# Altium footprint library LOCALLIBPCB1.PcbLib: 7 footprints
Each footprint in its own frame and in the unit in brackets; x right, y up, seen from the top. Pads: shape width x height; smd on the part's side, far side on the other; paste and mask are expansions set on the pad; w line width, h text height; cw(c..) or ccw(c..) is an arc to the next point about the centre after c.
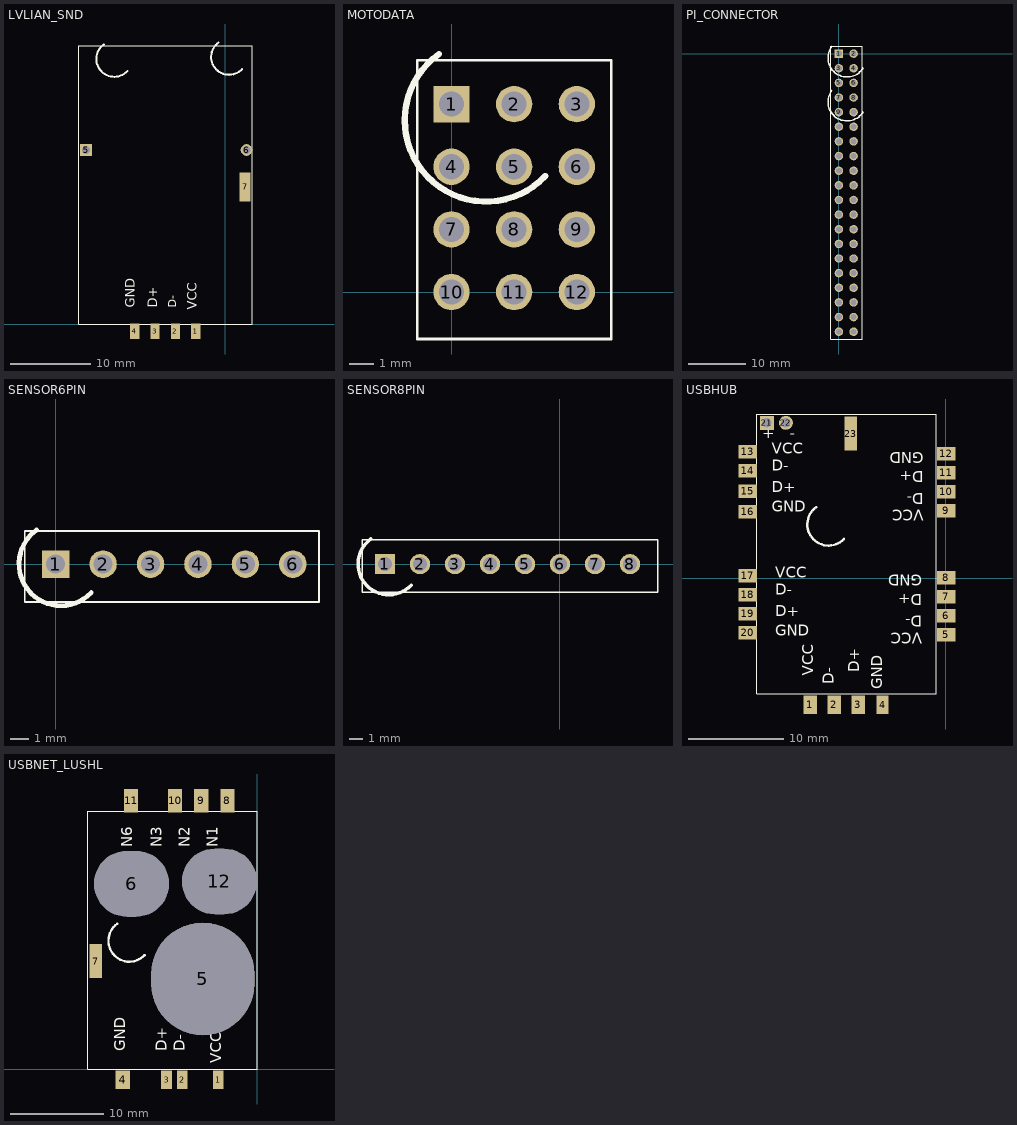
[diagram p0: the footprints below, top view; thin cyan lines are the x and y axes]

## LVLIAN_SND [mil] "绿联声卡"
pads (7):
  rect 45x77 smd: 1(-145,-35) 2(-245,-35) 3(-345,-35) 4(-445,-35)
  rect 58x58 hole 40: 5(-685,856.81)
  round 58 hole 40: 6(105,856.81)
  rect 53.15x141.73 smd: 7(97.83,675)
Top Overlay:
  lines w4: -722.17,0 -722.17,1370.08 132.17,1370.08 132.17,0 -722.17,0
  lines w10: -597.23,1377.02 ccw(c-546.29,1305.27) -482.17,1245 ; -32.23,1387.02 ccw(c18.71,1315.27) 82.83,1255
  text "GND" at -427.17,80 h78.74
  text "D+" at -317.17,80 h78.74
  text "D-" at -227.17,80 h67.32
  text "VCC" at -122.17,70 h78.74

## MOTODATA [mil] "4路舵机信号插件"
pads (12):
  rect 58x58 hole 40: 1(0,300)
  round 58 hole 40: 2(100,300) 3(200,300) 4(0,200) 5(100,200) 6(200,200) 7(0,100) 8(100,100) 9(200,100) 10(0,0) 11(100,0) 12(200,0)
Top Overlay:
  lines w4: -55,-75 -55,370 255,370 255,-75 -55,-75
  lines w10: -20,380 ccw(c55.14,274.15) 149.73,185.25

## PI_CONNECTOR [mil] "pi3上的40针插件"
pads (40):
  rect 58x58 hole 40: 1(0,0)
  round 58 hole 40: 2(100,0) 3(0,-100) 4(100,-100) 5(0,-200) 6(100,-200) 7(0,-300) 8(100,-300) 9(0,-400) 10(100,-400) 11(0,-500) 12(100,-500) 13(0,-600) 14(100,-600) 15(0,-700) 16(100,-700) 17(0,-800) 18(100,-800) 19(0,-900) 20(100,-900) 21(0,-1000) 22(100,-1000) 23(0,-1100) 24(100,-1100) 25(0,-1200) 26(100,-1200) 27(0,-1300) 28(100,-1300) 29(0,-1400) 30(100,-1400) 31(0,-1500) 32(100,-1500) 33(0,-1600) 34(100,-1600) 35(0,-1700) 36(100,-1700) 37(0,-1800) 38(100,-1800) 39(0,-1900) 40(100,-1900)
Top Overlay:
  lines w4: -55,-1950 -55,50 160,50 160,-1950 -55,-1950
  lines w10: -48.13,48.58 ccw(c55.19,-30) 166.9,-96.12 ; -47.59,-250.72 ccw(c55.19,-330) 166.9,-396.12

## SENSOR6PIN [mil] "6针传感器"
pads (6):
  rect 58x58 hole 40: 1(0,0)
  round 58 hole 40: 2(100,0) 3(200,0) 4(300,0) 5(400,0) 6(500,0)
Top Overlay:
  lines w4: -65,-80 -65,70 555,70 555,-80 -65,-80
  lines w10: -40.06,72.02 ccw(c10.88,0.27) 75,-60

## SENSOR8PIN [mil] "8针传感器"
pads (8):
  rect 58x58 hole 40: 1(-500,0)
  round 58 hole 40: 2(-400,0) 3(-300,0) 4(-200,0) 5(-100,0) 6(0,0) 7(100,0) 8(200,0)
Top Overlay:
  lines w4: -565,-80 -565,70 280,70 280,-80 -565,-80
  lines w10: -540.06,72.02 ccw(c-489.12,0.27) -425,-60

## USBHUB [mil] "USB一转四"
pads (23):
  rect 56.3x77 smd: 1(-562.95,-525) 2(-462.95,-525) 3(-362.95,-525)
  rect 51.18x77 smd: 4(-262.95,-525)
  rect 77x56.3 smd: 5(2.05,-235) 6(2.05,-156.26) 7(2.05,-77.52) 8(2.05,1.22) 9(2.05,280) 10(2.05,358.74) 11(2.05,437.48) 12(2.05,516.22) 13(-822.95,525) 14(-822.95,446.26) 15(-822.95,360) 16(-822.95,275) 17(-822.95,10) 18(-822.95,-68.74) 19(-822.95,-147.48) 20(-822.95,-226.22)
  rect 58x58 hole 40: 21(-742.95,645)
  round 58 hole 40: 22(-664.21,645)
  rect 53.15x141.73 smd: 23(-395,600)
Top Overlay:
  lines w4: -785,-480 -40.91,-480 -40.91,681.42 -785,681.42 -785,-480
  lines w10: -537.95,295 ccw(c-487.01,223.24) -422.89,162.98
  text "+   -" at -762.95,565 h78.74
  text "GND" at -707.95,-255 h78.74
  text "D+" at -707.95,-175 h78.74
  text "D-" at -707.95,-85 h78.74
  text "VCC" at -707.95,-15 h78.74
  text "GND" at -722.95,260 h78.74
  text "D+" at -722.95,340 h78.74
  text "D-" at -722.95,430 h78.74
  text "VCC" at -722.95,500 h78.74
  text "GND" at -92.95,540 h78.74
  text "D+" at -92.95,460 h78.74
  text "D-" at -92.95,370 h78.74
  text "VCC" at -92.95,300 h78.74
  text "VCC" at -97.95,-210 h78.74
  text "D-" at -97.95,-140 h78.74
  text "D+" at -97.95,-50 h78.74
  text "GND" at -97.95,30 h78.74
  text "GND" at -247.95,-460 h78.74
  text "D+" at -342.95,-390 h78.74
  text "D-" at -447.95,-440 h78.74
  text "VCC" at -532.95,-405 h78.74

## USBNET_LUSHL [mm] "铝壳USB转NET"
pads (12):
  rect 1.143x1.956 smd: 1(-4.18,-1.143) 2(-8.05,-1.143) 3(-9.72,-1.143)
  rect 1.53x1.956 smd: 4(-14.39,-1.143)
  oval 11x12 hole 11 slot 12 at 90 deg: 5(-5.842,9.652)
  round 7 hole 7 slot 8 at 0 deg: 6(-13.462,19.812) 12(-4.064,20.066)
  rect 1.35x3.6 smd: 7(-17.272,11.557)
  rect 1.5x2.5 smd: 8(-3.214,28.702) 9(-6.008,28.702) 10(-8.802,28.702) 11(-13.501,28.702)
Top Overlay:
  lines w0.102: -18.161,0 0,0 0,27.57 -18.161,27.57 -18.161,0
  lines w0.254: -14.988,15.545 ccw(c-13.694,13.723) -12.065,12.192
  text "N6" at -12.954,23.749 h2
  text "N3" at -9.821,23.749 h2
  text "N2" at -6.816,23.749 h2
  text "N1" at -3.81,23.749 h2
  text "GND" at -13.716,1.905 h2
  text "D+" at -9.271,1.905 h2
  text "D-" at -7.366,1.905 h2
  text "VCC" at -3.429,0.635 h2